# Altium footprint library 4.49-接插件.PcbLib: 260 footprints (part 15 of 17)
Each footprint in its own frame and in the unit in brackets; x right, y up, seen from the top. Pads: shape width x height; smd on the part's side, far side on the other; paste and mask are expansions set on the pad; w line width, h text height; cw(c..) or ccw(c..) is an arc to the next point about the centre after c.
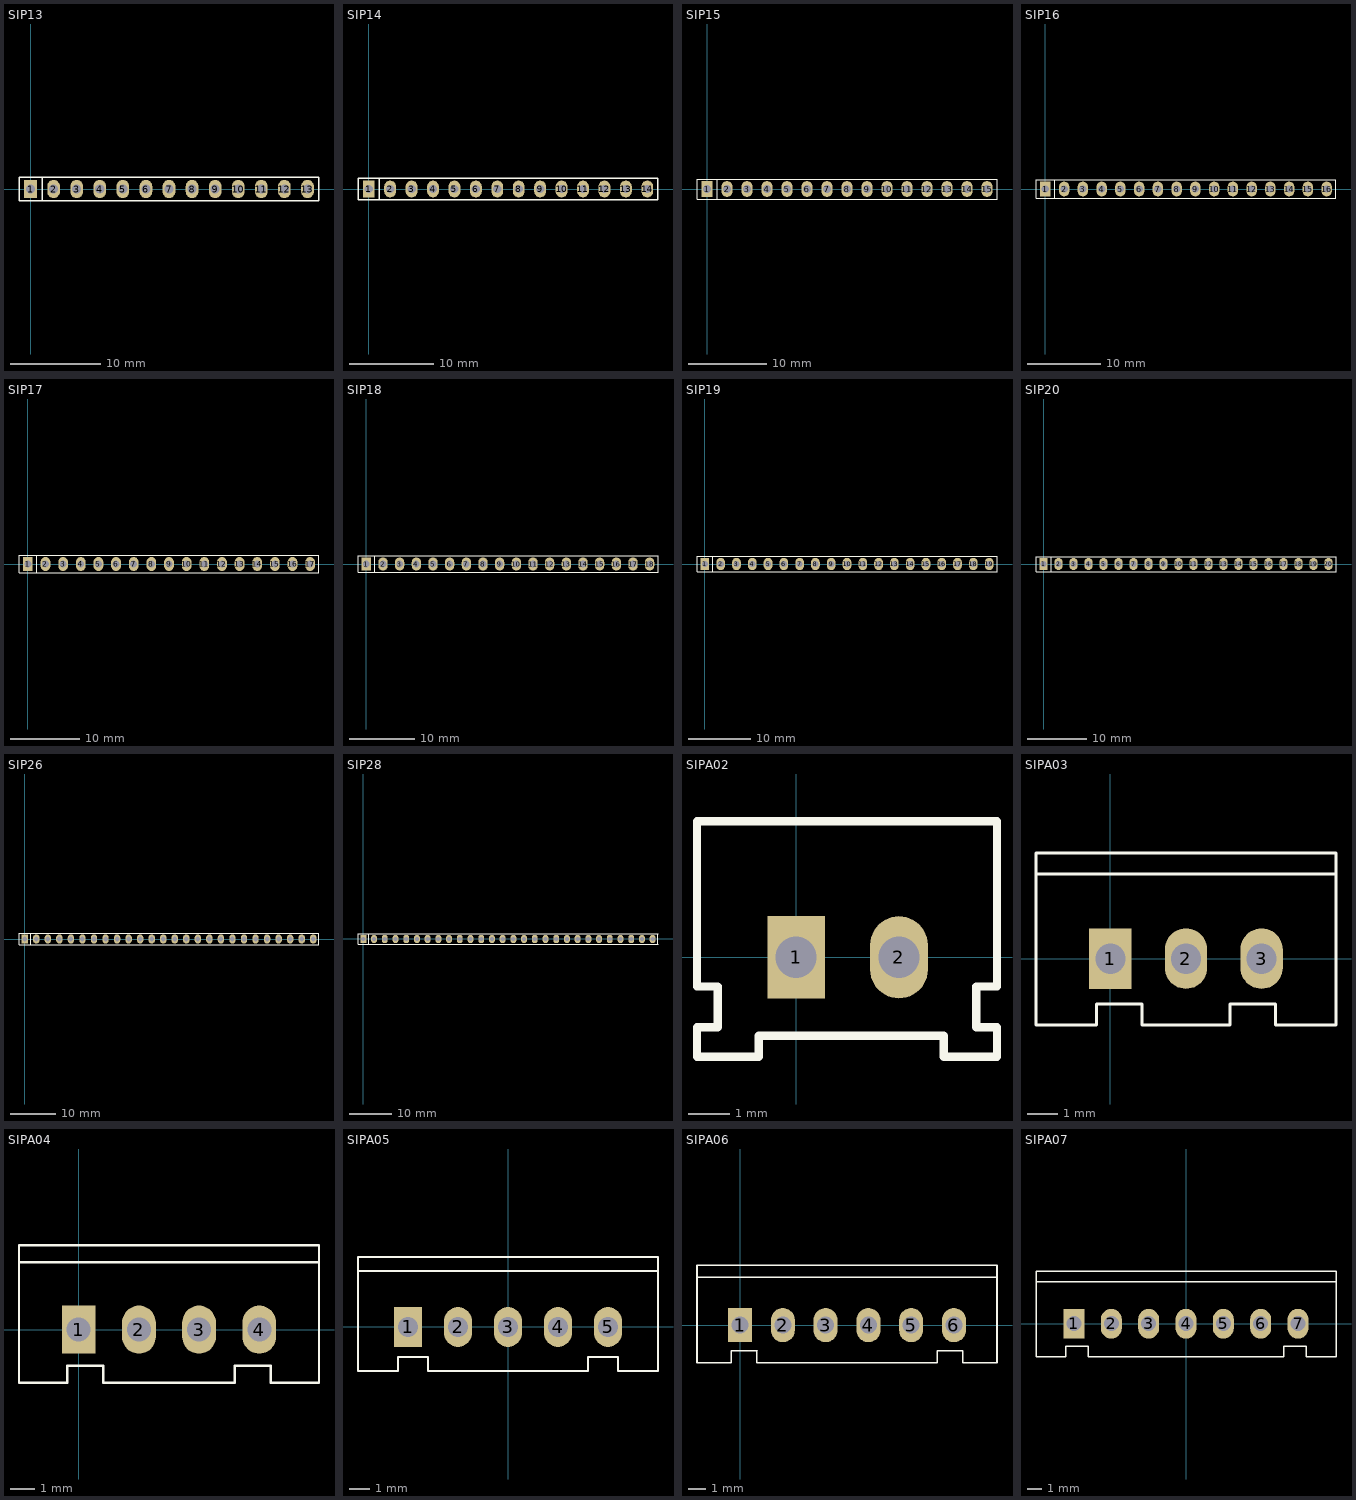
[diagram p14: the footprints below, top view; thin cyan lines are the x and y axes]

## SIP13 [mm]
pads (13):
  rect 1.4x2 hole 1: 1(0,0)
  oval 1.4x2 hole 1: 2(2.54,0) 3(5.08,0) 4(7.62,0) 5(10.16,0) 6(12.7,0) 7(15.24,0) 8(17.78,0) 9(20.32,0) 10(22.86,0) 11(25.4,0) 12(27.94,0) 13(30.48,0)
Top Overlay:
  lines w0.15: 1.27,-1.27 1.27,1.27 ; -1.27,-1.27 31.75,-1.27 31.75,1.27 -1.27,1.27 -1.27,-1.27
3D body "Samtec-13.step": height 8.89, standoff -2.03, extent -1.27,-1.27 31.75,1.27

## SIP14 [mm]
pads (14):
  rect 1.4x2 hole 1: 1(0,0)
  oval 1.4x2 hole 1: 2(2.54,0) 3(5.08,0) 4(7.62,0) 5(10.16,0) 6(12.7,0) 7(15.24,0) 8(17.78,0) 9(20.32,0) 10(22.86,0) 11(25.4,0) 12(27.94,0) 13(30.48,0) 14(33.02,0)
Top Overlay:
  lines w0.15: 1.27,-1.27 1.27,1.27 ; -1.27,-1.27 34.29,-1.27 34.29,1.27 -1.27,1.27 -1.27,-1.27
3D body "Samtec-14.step": height 8.89, standoff -2.03, extent -1.27,-1.27 34.29,1.27

## SIP15 [mm]
pads (15):
  rect 1.4x2 hole 1: 1(0,0)
  oval 1.4x2 hole 1: 2(2.54,0) 3(5.08,0) 4(7.62,0) 5(10.16,0) 6(12.7,0) 7(15.24,0) 8(17.78,0) 9(20.32,0) 10(22.86,0) 11(25.4,0) 12(27.94,0) 13(30.48,0) 14(33.02,0) 15(35.56,0)
Top Overlay:
  lines w0.15: 1.27,-1.27 1.27,1.27 ; -1.27,-1.27 36.83,-1.27 36.83,1.27 -1.27,1.27 -1.27,-1.27
3D body "Samtec-15.step": height 8.89, standoff -2.03, extent -1.27,-1.27 36.83,1.27

## SIP16 [mm]
pads (16):
  rect 1.4x2 hole 1: 1(0,0)
  oval 1.4x2 hole 1: 2(2.54,0) 3(5.08,0) 4(7.62,0) 5(10.16,0) 6(12.7,0) 7(15.24,0) 8(17.78,0) 9(20.32,0) 10(22.86,0) 11(25.4,0) 12(27.94,0) 13(30.48,0) 14(33.02,0) 15(35.56,0) 16(38.1,0)
Top Overlay:
  lines w0.15: 1.27,-1.27 1.27,1.27 ; -1.27,-1.27 39.37,-1.27 39.37,1.27 -1.27,1.27 -1.27,-1.27
3D body "Samtec-16.step": height 8.89, standoff -2.03, extent -1.27,-1.27 39.37,1.27

## SIP17 [mm]
pads (17):
  rect 1.4x2 hole 1: 1(0,0)
  oval 1.4x2 hole 1: 2(2.54,0) 3(5.08,0) 4(7.62,0) 5(10.16,0) 6(12.7,0) 7(15.24,0) 8(17.78,0) 9(20.32,0) 10(22.86,0) 11(25.4,0) 12(27.94,0) 13(30.48,0) 14(33.02,0) 15(35.56,0) 16(38.1,0) 17(40.64,0)
Top Overlay:
  lines w0.15: 1.27,-1.27 1.27,1.27 ; -1.27,-1.27 -1.27,1.27 41.91,1.27 41.91,-1.27 -1.27,-1.27
3D body "Samtec-17.step": height 8.89, standoff -2.03, extent -1.27,-1.27 41.91,1.27

## SIP18 [mm]
pads (18):
  rect 1.4x2 hole 1: 1(0,0)
  oval 1.4x2 hole 1: 2(2.54,0) 3(5.08,0) 4(7.62,0) 5(10.16,0) 6(12.7,0) 7(15.24,0) 8(17.78,0) 9(20.32,0) 10(22.86,0) 11(25.4,0) 12(27.94,0) 13(30.48,0) 14(33.02,0) 15(35.56,0) 16(38.1,0) 17(40.64,0) 18(43.18,0)
Top Overlay:
  lines w0.15: 1.27,-1.27 1.27,1.27 ; -1.27,-1.27 44.45,-1.27 44.45,1.27 -1.27,1.27 -1.27,-1.27
3D body "Samtec-18.step": height 8.89, standoff -2.03, extent -1.27,-1.27 44.45,1.27

## SIP19 [mm]
pads (19):
  rect 1.4x2 hole 1: 1(0,0)
  oval 1.4x2 hole 1: 2(2.54,0) 3(5.08,0) 4(7.62,0) 5(10.16,0) 6(12.7,0) 7(15.24,0) 8(17.78,0) 9(20.32,0) 10(22.86,0) 11(25.4,0) 12(27.94,0) 13(30.48,0) 14(33.02,0) 15(35.56,0) 16(38.1,0) 17(40.64,0) 18(43.18,0) 19(45.72,0)
Top Overlay:
  lines w0.15: 1.27,-1.27 1.27,1.27 ; -1.27,-1.27 46.99,-1.27 46.99,1.27 -1.27,1.27 -1.27,-1.27
3D body "Samtec-19.step": height 8.89, standoff -2.03, extent -1.27,-1.27 46.99,1.27

## SIP20 [mm]
pads (20):
  rect 1.4x2 hole 1: 1(0,0)
  oval 1.4x2 hole 1: 2(2.54,0) 3(5.08,0) 4(7.62,0) 5(10.16,0) 6(12.7,0) 7(15.24,0) 8(17.78,0) 9(20.32,0) 10(22.86,0) 11(25.4,0) 12(27.94,0) 13(30.48,0) 14(33.02,0) 15(35.56,0) 16(38.1,0) 17(40.64,0) 18(43.18,0) 19(45.72,0) 20(48.26,0)
Top Overlay:
  lines w0.15: 1.27,-1.27 1.27,1.27 ; -1.27,-1.27 49.53,-1.27 49.53,1.27 -1.27,1.27 -1.27,-1.27
3D body "Samtec-20.step": height 8.89, standoff -2.03, extent -1.27,-1.27 49.53,1.27

## SIP26 [mm]
pads (26):
  rect 1.4x2 hole 1: 1(0,0)
  oval 1.4x2 hole 1: 2(2.54,0) 3(5.08,0) 4(7.62,0) 5(10.16,0) 6(12.7,0) 7(15.24,0) 8(17.78,0) 9(20.32,0) 10(22.86,0) 11(25.4,0) 12(27.94,0) 13(30.48,0) 14(33.02,0) 15(35.56,0) 16(38.1,0) 17(40.64,0) 18(43.18,0) 19(45.72,0) 20(48.26,0) 21(50.8,0) 22(53.34,0) 23(55.88,0) 24(58.42,0) 25(60.96,0) 26(63.5,0)
Top Overlay:
  lines w0.15: 1.27,-1.27 1.27,1.27 ; -1.27,-1.27 -1.27,1.27 64.77,1.27 64.77,-1.27 -1.27,-1.27
3D body "Samtec-26.step": height 8.89, standoff -2.03, extent -1.27,-1.27 64.77,1.27

## SIP28 [mm]
pads (28):
  rect 1.4x2 hole 1: 1(0,0)
  oval 1.4x2 hole 1: 2(2.54,0) 3(5.08,0) 4(7.62,0) 5(10.16,0) 6(12.7,0) 7(15.24,0) 8(17.78,0) 9(20.32,0) 10(22.86,0) 11(25.4,0) 12(27.94,0) 13(30.48,0) 14(33.02,0) 15(35.56,0) 16(38.1,0) 17(40.64,0) 18(43.18,0) 19(45.72,0) 20(48.26,0) 21(50.8,0) 22(53.34,0) 23(55.88,0) 24(58.42,0) 25(60.96,0) 26(63.5,0) 27(66.04,0) 28(68.58,0)
Top Overlay:
  lines w0.15: 1.27,-1.27 1.27,1.27 ; -1.27,-1.27 -1.27,1.27 69.85,1.27 69.85,-1.27 -1.27,-1.27
3D body "Samtec-28.step": height 8.89, standoff -2.03, extent -1.27,-1.27 69.85,1.27

## SIPA02 [mm]
pads (2):
  rect 1.4x2 hole 1: 1(0,0)
  oval 1.4x2 hole 1: 2(2.5,0)
Top Overlay:
  lines w0.203: -2.408,-2.413 -2.408,-1.702 -1.9,-1.702 -1.9,-0.711 -2.408,-0.711 -2.408,3.302 4.882,3.302 4.882,1.6 4.882,-0.711 4.374,-0.711 4.374,-1.702 4.882,-1.702 4.882,-2.413 3.587,-2.413 3.587,-1.905 -0.909,-1.905 -0.909,-2.413 -2.408,-2.413
3D body "User Library-PW10-02-M green.step": height 7, standoff -3.3, extent -2.513,-2.296 4.987,3.404

## SIPA03 [mm]
pads (3):
  rect 1.4x2 hole 1: 1(0,0)
  oval 1.4x2 hole 1: 2(2.5,0) 3(5,0)
Top Overlay:
  lines w0.1: -2.46,2.8 7.46,2.8 ; -2.46,-2.2 -2.46,3.5 7.46,3.5 7.46,-2.2 5.46,-2.2 5.46,-1.5 3.96,-1.5 3.96,-2.2 1.04,-2.2 1.04,-1.5 -0.46,-1.5 -0.46,-2.2 -2.46,-2.2
3D body "User Library-CWF-3.step": height 7, standoff -3.5, extent -2.5,-2.25 7.5,3.45

## SIPA04 [mm]
pads (4):
  rect 1.4x2 hole 1: 1(0,0)
  oval 1.4x2 hole 1: 2(2.5,0) 3(5,0) 4(7.5,0)
Top Overlay:
  lines w0.1: -2.48,2.8 9.976,2.8 ; -2.48,-2.2 -2.48,3.5 9.98,3.5 9.98,-2.2 7.98,-2.2 7.98,-1.5 6.48,-1.5 6.48,-2.2 1.02,-2.2 1.02,-1.5 -0.48,-1.5 -0.48,-2.2 -2.48,-2.2
3D body "User Library-CWF-4.step": height 7, standoff -3.5, extent -2.5,-2.25 10,3.45

## SIPA05 [mm]
pads (5):
  rect 1.4x2 hole 1: 1(-5,0)
  oval 1.4x2 hole 1: 2(-2.5,0) 3(0,0) 4(2.5,0) 5(5,0)
Top Overlay:
  lines w0.1: -7.5,2.8 7.492,2.8 ; -7.5,-2.2 -5.5,-2.2 -5.5,-1.5 -4,-1.5 -4,-2.2 4,-2.2 4,-1.5 5.5,-1.5 5.5,-2.2 7.5,-2.2 7.5,3.5 -7.5,3.5 -7.5,-2.2
3D body "User Library-CWF-5.step": height 7, standoff -3.5, extent -7.5,-2.25 7.5,3.45

## SIPA06 [mm]
pads (6):
  rect 1.4x2 hole 1: 1(0,0)
  oval 1.4x2 hole 1: 2(2.5,0) 3(5,0) 4(7.5,0) 5(10,0) 6(12.5,0)
Top Overlay:
  lines w0.1: -2.52,2.8 15.001,2.8 ; -0.52,-1.5 -0.52,-2.2 -2.52,-2.2 -2.52,3.5 15.02,3.5 15.02,-2.2 13.02,-2.2 13.02,-1.5 11.52,-1.5 11.52,-2.2 0.98,-2.2 0.98,-1.5 ; -0.5,-1.5 1,-1.5
3D body "User Library-CWF-6.step": height 7, standoff -3.5, extent -2.5,-2.25 15,3.45

## SIPA07 [mm]
pads (7):
  rect 1.4x2 hole 1: 1(-7.5,0)
  oval 1.4x2 hole 1: 2(-5,0) 3(-2.5,0) 4(0,0) 5(2.5,0) 6(5,0) 7(7.5,0)
Top Overlay:
  lines w0.1: -10.04,2.8 10.036,2.8 ; -10.04,-2.2 -8.04,-2.2 -8.04,-1.5 -6.54,-1.5 -6.54,-2.2 6.54,-2.2 6.54,-1.5 8.04,-1.5 8.04,-2.2 10.04,-2.2 10.04,3.5 -10.04,3.5 -10.04,-2.2
3D body "User Library-CWF-7.step": height 7, standoff -3.5, extent -10,-2.25 10,3.45